# Altium footprint library Vowstar_IC_General.PcbLib: 139 footprints (part 9 of 9)
Each footprint in its own frame and in the unit in brackets; x right, y up, seen from the top. Pads: shape width x height; smd on the part's side, far side on the other; paste and mask are expansions set on the pad; w line width, h text height; cw(c..) or ccw(c..) is an arc to the next point about the centre after c.
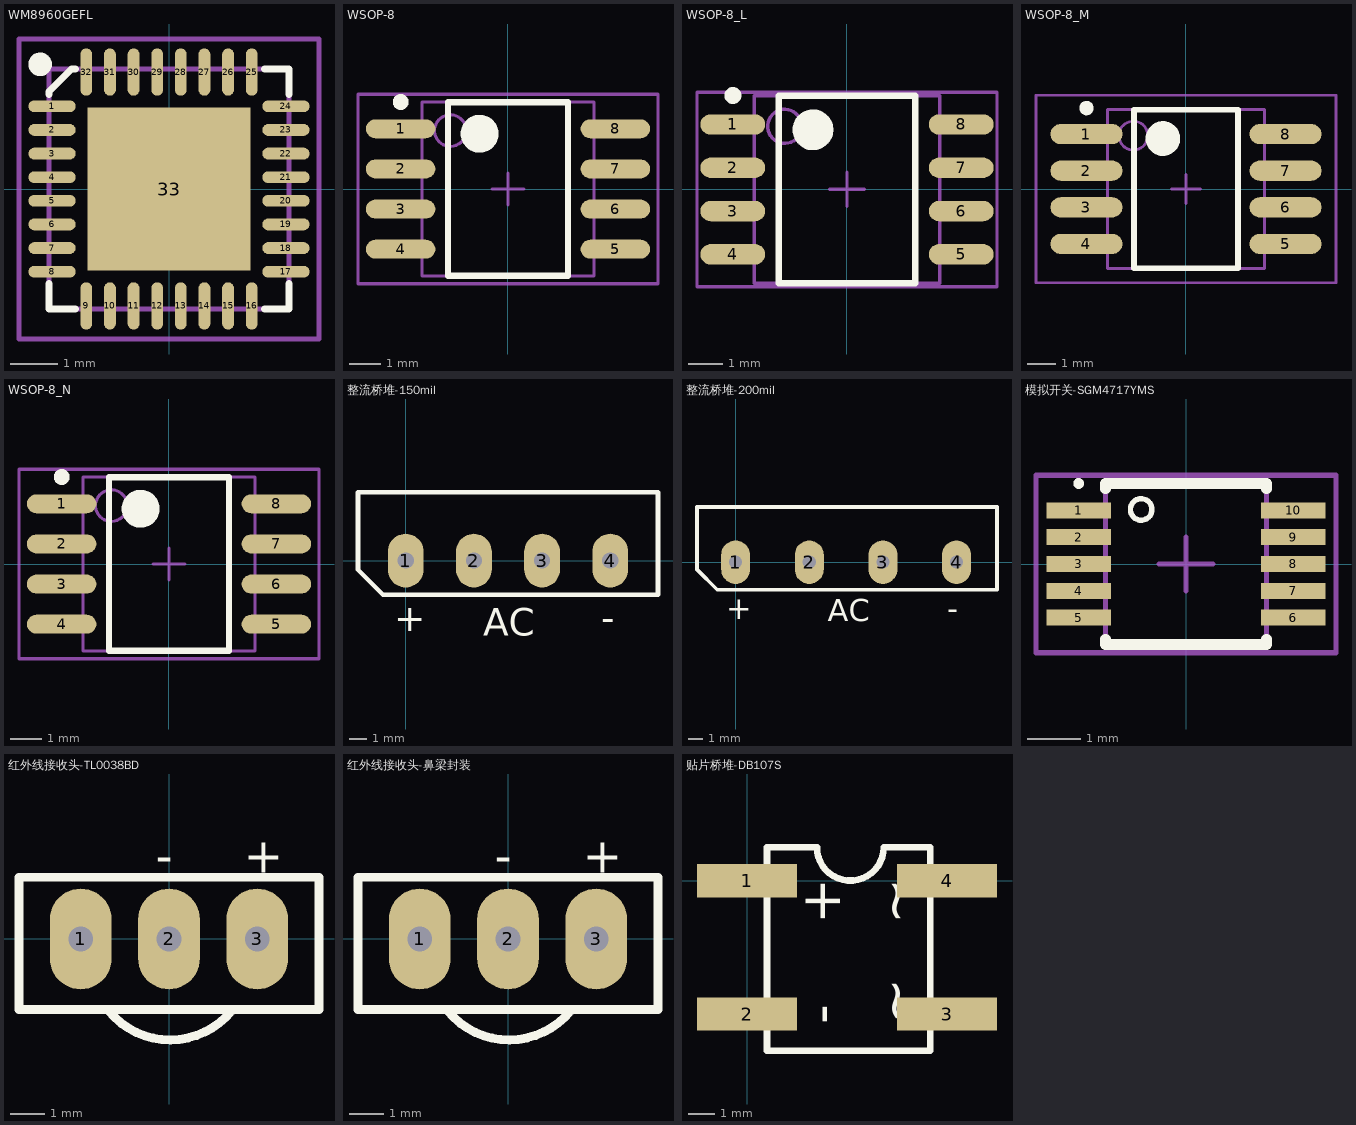
[diagram p8: the footprints below, top view; thin cyan lines are the x and y axes]

## WM8960GEFL [mm] "WM8960GEFL 32 PIN QFN PLASTIC PACKAGE 5 X 5 X 0.9 mm BODY, 0.50 mm LEAD PITCH"
height 0.9
pads (33):
  oval 1x0.25 smd: 1(-2.475,1.75) 2(-2.475,1.25) 3(-2.475,0.75) 4(-2.475,0.25) 5(-2.475,-0.25) 6(-2.475,-0.75) 7(-2.475,-1.25) 8(-2.475,-1.75) 17(2.475,-1.75) 18(2.475,-1.25) 19(2.475,-0.75) 20(2.475,-0.25) 21(2.475,0.25) 22(2.475,0.75) 23(2.475,1.25) 24(2.475,1.75)
  oval 0.25x1 smd: 9(-1.75,-2.475) 10(-1.25,-2.475) 11(-0.75,-2.475) 12(-0.25,-2.475) 13(0.25,-2.475) 14(0.75,-2.475) 15(1.25,-2.475) 16(1.75,-2.475) 25(1.75,2.475) 26(1.25,2.475) 27(0.75,2.475) 28(0.25,2.475) 29(-0.25,2.475) 30(-0.75,2.475) 31(-1.25,2.475) 32(-1.75,2.475)
  rect 3.45x3.45 smd paste-1.73: 33(0,0)
Top Overlay:
  circle w0.25: c-2.727,2.639 r0.125
  lines w0.15: -2.54,-2 -2.54,-2.54 -1.975,-2.54 ; -2.54,2 -2.54,2.066 -2.066,2.54 -1.975,2.54 ; 2.025,-2.54 2.54,-2.54 2.54,-2 ; 2.025,2.54 2.54,2.54 2.54,2
Top Paste:
  drawing of 25 lines, arcs and shapes, not listed
Mechanical 13:
  lines w0.1: -2.54,-2.54 2.54,-2.54 2.54,2.54 -2.54,2.54 -2.54,-2.54
Mechanical 15:
  lines w0.1: -0.5,0 0.5,0 ; 0,-0.5 0,0.5 ; -3.175,-3.175 -3.175,3.175 3.175,3.175 3.175,-3.175 -3.175,-3.175
3D body "User Library-QFN-32-5x5mm-WithPad.step": height 0.8, standoff 0, extent -2.515,-2.515 2.505,2.505

## WSOP-8 [mm] "8-Pin Small Outline Package 1.27 mm Pitch, IPC Medium Density"
height 2.03
pads (8):
  oval 2.2x0.6 smd: 1(-3.4,1.905) 2(-3.4,0.635) 3(-3.4,-0.635) 4(-3.4,-1.905) 5(3.4,-1.905) 6(3.4,-0.635) 7(3.4,0.635) 8(3.4,1.905)
Top Overlay:
  circle w0.6: c-0.9,1.75 r0.3
  circle w0.25: c-3.4,2.755 r0.125
  lines w0.2: -1.9,-2.75 1.9,-2.75 1.9,2.75 -1.9,2.75 -1.9,-2.75
Mechanical 13:
  circle w0.1: c-1.825,1.85 r0.5
  lines w0.1: -2.725,-2.75 2.725,-2.75 2.725,2.75 -2.725,2.75 -2.725,-2.75
Mechanical 15:
  lines w0.1: -0.5,0 0.5,0 ; 0,-0.5 0,0.5 ; -4.75,-3 4.75,-3 4.75,3 -4.75,3 -4.75,-3
3D body "User Library-SO8-Wide-5mmx5mm.step": height 1.75, standoff -0.01, extent -4.051,-2.73 4.05,2.73

## WSOP-8_L [mm] "8-Pin Small Outline Package 1.27 mm Pitch, IPC High Density"
height 2.03
pads (8):
  oval 1.9x0.6 smd: 1(-3.35,1.905) 2(-3.35,0.635) 3(-3.35,-0.635) 4(-3.35,-1.905) 5(3.35,-1.905) 6(3.35,-0.635) 7(3.35,0.635) 8(3.35,1.905)
Top Overlay:
  circle w0.6: c-1,1.75 r0.3
  circle w0.25: c-3.35,2.755 r0.125
  lines w0.2: -2,-2.75 2,-2.75 2,2.75 -2,2.75 -2,-2.75
Mechanical 13:
  circle w0.1: c-1.825,1.85 r0.5
  lines w0.1: -2.725,-2.75 2.725,-2.75 2.725,2.75 -2.725,2.75 -2.725,-2.75
Mechanical 15:
  lines w0.1: -0.5,0 0.5,0 ; 0,-0.5 0,0.5 ; -4.4,-2.85 4.4,-2.85 4.4,2.85 -4.4,2.85 -4.4,-2.85
3D body "User Library-SO8-Wide-5mmx5mm.step": height 1.75, standoff -0.01, extent -4.051,-2.73 4.05,2.73

## WSOP-8_M [mm] "8-Pin Small Outline Package 1.27 mm Pitch, IPC Low Density"
height 2.03
pads (8):
  oval 2.5x0.7 smd: 1(-3.45,1.905) 2(-3.45,0.635) 3(-3.45,-0.635) 4(-3.45,-1.905) 5(3.45,-1.905) 6(3.45,-0.635) 7(3.45,0.635) 8(3.45,1.905)
Top Overlay:
  circle w0.25: c-3.45,2.805 r0.125
  circle w0.6: c-0.8,1.75 r0.3
  lines w0.2: -1.8,-2.75 -1.8,2.75 1.8,2.75 1.8,-2.75 -1.8,-2.75
Mechanical 13:
  circle w0.1: c-1.825,1.85 r0.5
  lines w0.1: -2.725,-2.75 -2.725,2.75 2.725,2.75 2.725,-2.75 -2.725,-2.75
Mechanical 15:
  lines w0.1: -0.5,0 0.5,0 ; 0,-0.5 0,0.5 ; -5.2,-3.25 -5.2,3.25 5.2,3.25 5.2,-3.25 -5.2,-3.25
3D body "User Library-SO8-Wide-5mmx5mm.step": height 1.75, standoff -0.01, extent -4.051,-2.73 4.05,2.73

## WSOP-8_N [mm] "8-Pin Small Outline Package 1.27 mm Pitch, IPC Medium Density"
height 2.03
pads (8):
  oval 2.2x0.6 smd: 1(-3.4,1.905) 2(-3.4,0.635) 3(-3.4,-0.635) 4(-3.4,-1.905) 5(3.4,-1.905) 6(3.4,-0.635) 7(3.4,0.635) 8(3.4,1.905)
Top Overlay:
  circle w0.25: c-3.4,2.755 r0.125
  circle w0.6: c-0.9,1.75 r0.3
  lines w0.2: -1.9,-2.75 -1.9,2.75 1.9,2.75 1.9,-2.75 -1.9,-2.75
Mechanical 13:
  circle w0.1: c-1.825,1.85 r0.5
  lines w0.1: -2.725,-2.75 -2.725,2.75 2.725,2.75 2.725,-2.75 -2.725,-2.75
Mechanical 15:
  lines w0.1: -0.5,0 0.5,0 ; 0,-0.5 0,0.5 ; -4.75,-3 -4.75,3 4.75,3 4.75,-3 -4.75,-3
3D body "User Library-SO8-Wide-5mmx5mm.step": height 1.75, standoff -0.01, extent -4.051,-2.73 4.05,2.73

## 整流桥堆-150mil [mm] "整流桥堆-150mil"
height 15
pads (4):
  oval 2x3 hole 0.9: 1(0,0) 2(3.81,0) 3(7.62,0) 4(11.43,0)
Top Overlay:
  lines w0.254: -2.667,-0.508 -2.667,-0.381 -2.667,3.81 14.097,3.81 14.097,-1.905 -1.27,-1.905 -2.667,-0.508
  text "+" at -0.635,-3.937 h1.52
  text "AC" at 4.318,-4.191 h1.52
  text "-" at 10.922,-3.937 h1.52
3D body: height 10, standoff 0.5, extent -2.667,-1.905 14.097,3.81

## 整流桥堆-200mil [mm] "整流桥堆-200mil"
height 15
pads (4):
  oval 2x3 hole 0.9: 1(0,0) 2(5.08,0) 3(10.16,0) 4(15.24,0)
Top Overlay:
  lines w0.254: -2.667,-0.508 -1.27,-1.905 18.034,-1.905 18.034,3.81 -2.667,3.81 -2.667,-0.381 -2.667,-0.508
  text "-" at 14.605,-3.937 h1.52
  text "AC" at 6.35,-4.064 h1.52
  text "+" at -0.635,-3.937 h1.52
3D body: height 10, standoff 0.5, extent -2.667,-1.905 18.034,3.937

## 模拟开关-SGM4717YMS [mm] "模拟开关-SGM4717YMS"
height 1.2
pads (10):
  rect 1.2x0.3 smd: 1(-2,1) 2(-2,0.5) 3(-2,0) 4(-2,-0.5) 5(-2,-1) 6(2,-1) 7(2,-0.5) 8(2,0) 9(2,0.5) 10(2,1)
Top Overlay:
  circle w0.1: c-2,1.5 r0.05
  circle w0.1: c-0.835,1.016 r0.2
  lines w0.2: -1.5,-1.4 -1.5,-1.5 1.5,-1.5 1.5,-1.4 ; -1.5,1.4 -1.5,1.5 1.5,1.5 1.5,1.4
Mechanical 13:
  lines w0.1: -1.5,-1.5 -1.5,1.5 1.5,1.5 1.5,-1.5 -1.5,-1.5
Mechanical 15:
  lines w0.1: -0.5,0 0.5,0 ; 0,-0.5 0,0.5 ; -2.794,-1.651 -2.794,1.651 2.794,1.651 2.794,-1.651 -2.794,-1.651
3D body: height 1, standoff 0, extent -1.524,-1.524 1.524,1.524

## 红外线接收头-TL0038BD [mil] "红外线接收头-TL0038BD"
height 299.21
pads (3):
  oval 70x114.17 hole 28: 1(-100,0) 2(0,0) 3(100,0)
Top Overlay:
  lines w10: -68.22,-81.8 ccw(c1.23,-24.34) 71.29,-81.05 ; -170,-80 170,-80 170,70 -170,70 -170,-80
  text "+" at 85,75 h39.37
  text "-" at -15,75 h39.37

## 红外线接收头-鼻梁封装 [mil] "红外线接收头-鼻梁封装"
height 299.21
pads (3):
  oval 70x114.17 hole 28: 1(-100,0) 2(0,0) 3(100,0)
Top Overlay:
  lines w10: -68.22,-81.8 ccw(c1.23,-24.34) 71.29,-81.05 ; -170,-80 -170,70 170,70 170,-80 -170,-80
  text "-" at -15,75 h39.37
  text "+" at 85,75 h39.37

## 贴片桥堆-DB107S [mm] "贴片桥堆-DB107S"
height 2.54
pads (4):
  rect 3.81x1.27 smd: 1(0,0) 2(0,-5.08) 3(7.62,-5.08) 4(7.62,0)
Top Overlay:
  lines w0.254: 0.762,-6.477 6.985,-6.477 6.985,1.27 5.207,1.27 cw(c3.937,1.27) 2.667,1.27 0.762,1.27 0.762,-6.477
  text "~" at 6.35,-5.461 h1.52
  text "~" at 6.35,-1.651 h1.52
  text "-" at 3.556,-5.461 h1.52
  text "+" at 3.556,-1.651 h1.52
3D body: height 2.54, standoff 0, extent 0.762,-6.477 6.985,1.27